# Altium footprint library 5.12-直插元件.PcbLib: 165 footprints (part 5 of 11)
Each footprint in its own frame and in the unit in brackets; x right, y up, seen from the top. Pads: shape width x height; smd on the part's side, far side on the other; paste and mask are expansions set on the pad; w line width, h text height; cw(c..) or ccw(c..) is an arc to the next point about the centre after c.
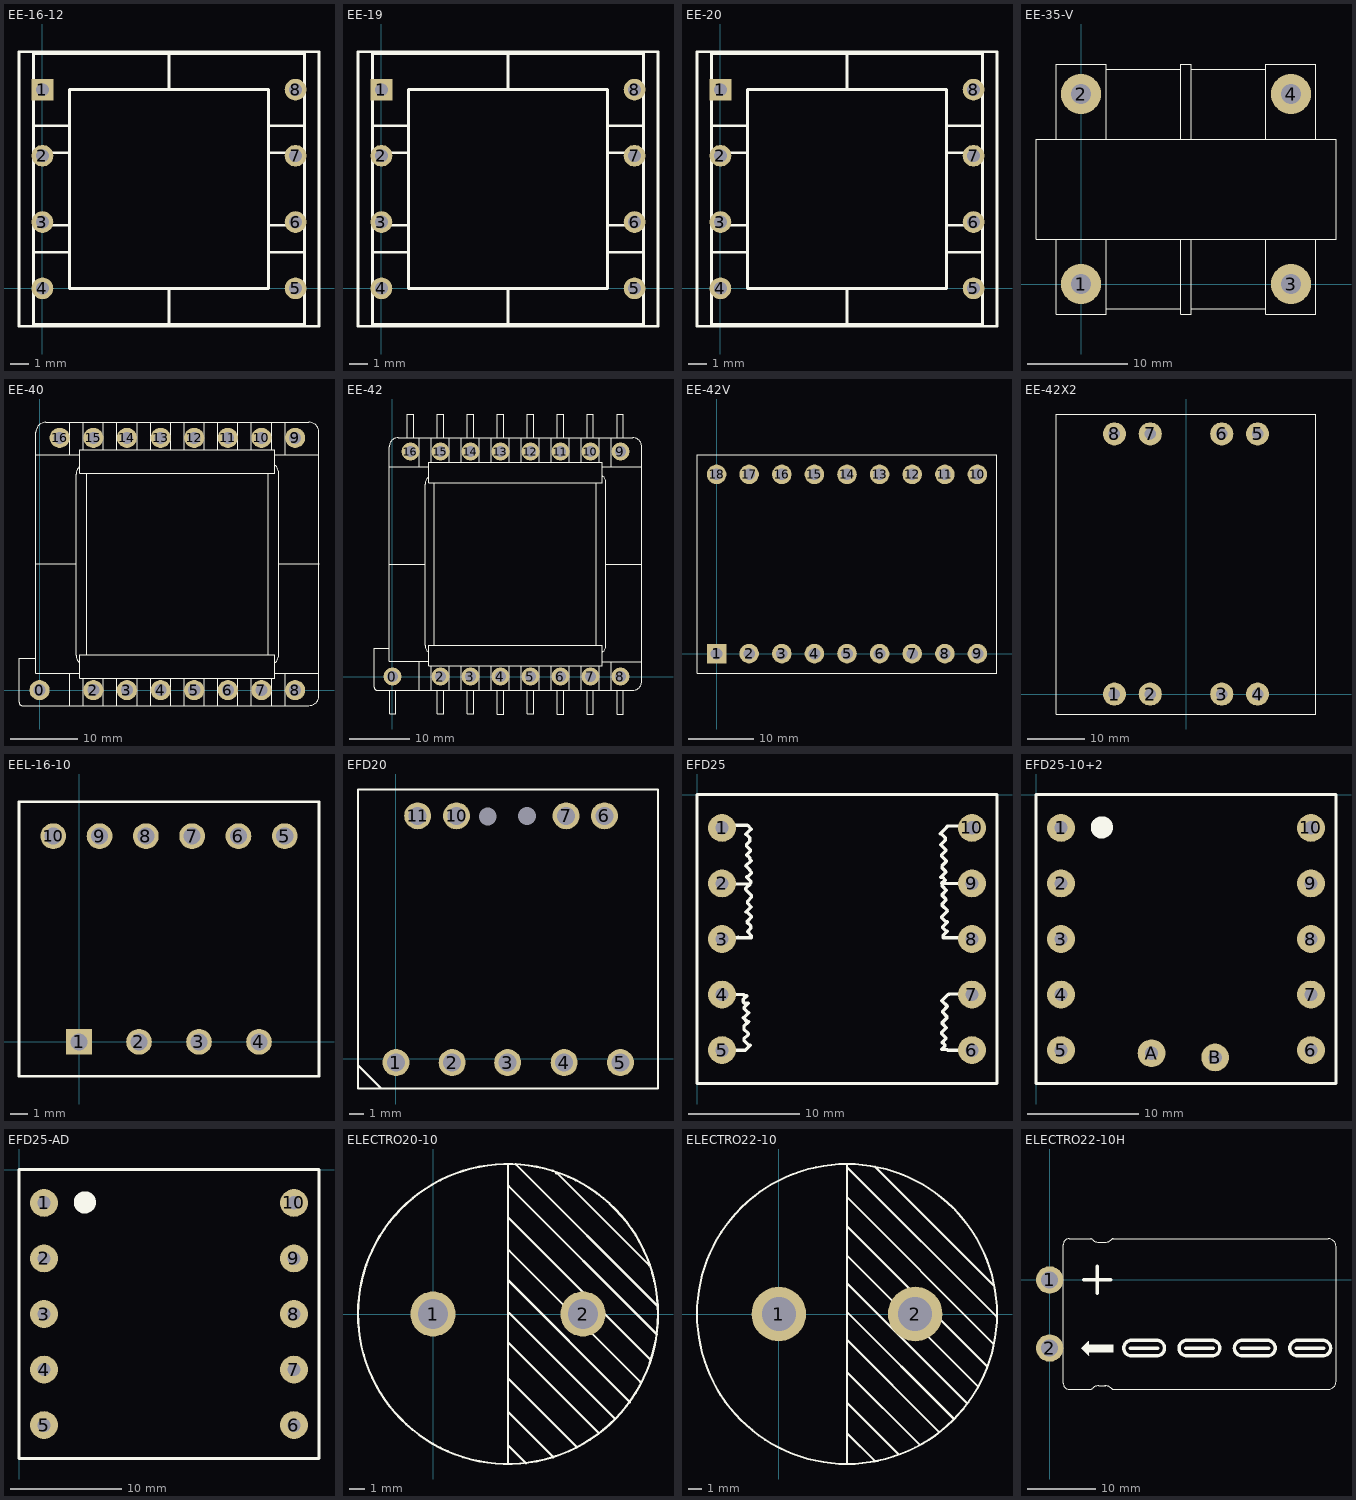
[diagram p4: the footprints below, top view; thin cyan lines are the x and y axes]

## EE-16-12 [mm] "[ PCBѧϰȺ514746572 ]"
pads (8):
  rect 1.2x1.2 hole 0.7: 1(0,11)
  round 1.2 hole 0.7: 2(0,7.34) 3(0,3.67) 4(0,0) 5(14,0) 6(14,3.67) 7(14,7.34) 8(14,11)
Top Overlay:
  lines w0.15: -0.5,2 1.5,2 ; -0.5,3.5 1.5,3.5 ; -0.5,7.5 1.5,7.5 ; -0.5,9 1.5,9 ; 7,-2 7,0 ; 7,11 7,13 ; 12.5,2 14.5,2 ; 12.5,3.5 14.5,3.5 ; 12.5,7.5 14.5,7.5 ; 12.5,9 14.5,9 ; -1.3,-2.1 -1.3,13.1 15.3,13.1 15.3,-2.1 -1.3,-2.1 ; -0.5,-2 -0.5,13 14.5,13 14.5,-2 -0.5,-2 ; 1.5,0 12.5,0 12.5,11 1.5,11 1.5,0
3D body "User Library-EE-16A.step": height 17.95, standoff -3.1, extent -0.965,-3.175 14.935,14.525

## EE-19 [mm] "[ PCBѧϰȺ514746572 ]"
pads (8):
  rect 1.2x1.2 hole 0.7: 1(0,11)
  round 1.2 hole 0.7: 2(0,7.34) 3(0,3.67) 4(0,0) 5(14,0) 6(14,3.67) 7(14,7.34) 8(14,11)
Top Overlay:
  lines w0.15: -0.5,2 1.5,2 ; -0.5,3.5 1.5,3.5 ; -0.5,7.5 1.5,7.5 ; -0.5,9 1.5,9 ; 7,-2 7,0 ; 7,11 7,13 ; 12.5,2 14.5,2 ; 12.5,3.5 14.5,3.5 ; 12.5,7.5 14.5,7.5 ; 12.5,9 14.5,9 ; -1.3,-2.1 15.3,-2.1 15.3,13.1 -1.3,13.1 -1.3,-2.1 ; -0.5,-2 14.5,-2 14.5,13 -0.5,13 -0.5,-2 ; 1.5,0 1.5,11 12.5,11 12.5,0 1.5,0
3D body "User Library-EE-19C.step": height 19.2, standoff -4.65, extent -1.24,-3.946 14.5,15.654

## EE-20 [mm] "[ PCBѧϰȺ514746572 ]"
pads (8):
  rect 1.2x1.2 hole 0.7: 1(0,11)
  round 1.2 hole 0.7: 2(0,7.34) 3(0,3.67) 4(0,0) 5(14,0) 6(14,3.67) 7(14,7.34) 8(14,11)
Top Overlay:
  lines w0.15: -0.5,2 1.5,2 ; -0.5,3.5 1.5,3.5 ; -0.5,7.5 1.5,7.5 ; -0.5,9 1.5,9 ; 7,-2 7,0 ; 7,11 7,13 ; 12.5,2 14.5,2 ; 12.5,3.5 14.5,3.5 ; 12.5,7.5 14.5,7.5 ; 12.5,9 14.5,9 ; -1.3,-2.1 15.3,-2.1 15.3,13.1 -1.3,13.1 -1.3,-2.1 ; -0.5,-2 14.5,-2 14.5,13 -0.5,13 -0.5,-2 ; 1.5,0 1.5,11 12.5,11 12.5,0 1.5,0
3D body "User Library-Phone Line Transformer.step": height 17, standoff -2, extent -1.732,-4.471 15.768,15.529

## EE-35-V [mm] "[ PCBѧϰȺ514746572 ]"
pads (4):
  round 4 hole 2: 1(0,0) 2(0,19) 3(21,0) 4(21,19)
Top Overlay:
  lines w0.1: 2.5,-2.453 10,-2.453 ; 2.5,4.5 2.5,-3 -2.5,-3 -2.5,4.5 ; 2.5,14.5 2.5,22 -2.5,22 ; 2.5,21.453 10,21.453 ; 10,4.5 10,-3 11,-3 11,4.5 ; 10,14.5 10,22 11,22 11,14.5 ; 11,-2.453 18.5,-2.453 ; 11,21.453 18.5,21.453 ; 18.5,4.5 18.5,-3 23.5,-3 23.5,4.5 ; 18.5,14.5 18.5,22 23.5,22 23.5,14.5 ; -2.5,4.5 23.5,4.5 ; -2.5,4.5 -4.5,4.5 -4.5,14.5 25.5,14.5 25.5,4.5 23.5,4.5 ; -2.5,22 -2.5,14.5 -2.5,22 ; 0,19.25 0,19.25
3D body "ee35-4.STEP": height 35.61, standoff -5.5, extent -4.23,-2.75 25.23,21.75

## EE-40 [mm] "[ PCBѧϰȺ514746572 ]"
pads (16):
  round 3 hole 1.8: 0(0,0) 2(8,0) 3(13,0) 4(18,0) 5(23,0) 6(28,0) 7(33,0) 8(38,0) 9(38,37.5) 10(33,37.5) 11(28,37.5) 12(23,37.5) 13(18,37.5) 14(13,37.5) 15(8,37.5) 16(3,37.5)
Top Overlay:
  lines w0.1: -2.55,-2.303 40.05,-2.303 ; -2.55,-2.3 cw(c-2.55,-1.8) -3.05,-1.8 -3.05,4.7 -0.556,4.7 ; -0.55,2.509 -0.55,38.3 cw(c0.95,38.3) 0.95,39.8 40.05,39.8 cw(c40.05,38.3) 41.55,38.3 41.55,-0.8 cw(c40.05,-0.8) 40.05,-2.3 ; -0.55,18.75 5.449,18.75 ; -0.544,2.509 6,2.509 ; -0.544,34.991 6,34.991 ; 4.5,-2.303 4.5,2.509 ; 4.5,34.991 4.5,39.8 ; 5.995,4.043 cw(c6.949,5.2) 5.449,5.2 5.449,32.079 cw(c6.949,32.079) 5.995,33.236 ; 6.5,-2.303 6.5,1.75 ; 6.5,35.75 6.5,39.8 ; 7,5.25 7,32.25 ; 9.5,-2.303 9.5,1.75 ; 9.5,35.75 9.5,39.8 ; 11.5,-2.303 11.5,1.75 ; 11.5,35.75 11.5,39.8 ; 14.5,-2.303 14.5,1.75 ; 14.5,35.75 14.5,39.8 ; 16.5,-2.303 16.5,1.75 ; 16.5,35.75 16.5,39.8 ; 19.5,-2.303 19.5,1.75 ; 19.5,35.75 19.5,39.8 ; 21.5,-2.303 21.5,1.75 ; 21.5,35.75 21.5,39.8 ; 24.5,-2.303 24.5,1.75 ; 24.5,35.75 24.5,39.8 ; 26.5,-2.303 26.5,1.75 ; 26.5,35.75 26.5,39.8 ; 29.5,-2.303 29.5,1.75 ; 29.5,35.75 29.5,39.8 ; 31.5,-2.303 31.5,1.75 ; 31.5,35.75 31.5,39.8 ; 34,5.25 34,32.25 ; 34.5,-2.303 34.5,1.75 ; 34.5,35.75 34.5,39.8 ; 35,2.5 41.55,2.5 ; 35,35 41.55,35 ; 35.005,4.042 ccw(c34.051,5.199) 35.551,5.199 35.551,32.3 ccw(c34.051,32.3) 35.005,33.457 ; 35.551,18.75 41.55,18.75 ; 36.5,-2.303 36.5,2.5 ; 36.5,35 36.5,39.8 ; 6,1.75 6,5.25 35,5.25 35,1.75 ; 6,1.75 35,1.75 ; 6,1.75 35,1.75 ; 6,32.25 6,35.75 35,35.75 35,32.25 6,32.25
3D body "User Library-power_transformer.step": height 32.94, standoff -3.5, extent 0.254,-3.478 40.259,40.562

## EE-42 [mm] "[ PCBѧϰȺ514746572 ]"
pads (16):
  round 3 hole 1.8: 0(0,0) 2(8,0) 3(13,0) 4(18,0) 5(23,0) 6(28,0) 7(33,0) 8(38,0) 9(38,37.5) 10(33,37.5) 11(28,37.5) 12(23,37.5) 13(18,37.5) 14(13,37.5) 15(8,37.5) 16(3,37.5)
Top Overlay:
  lines w0.1: -2.55,-2.303 40.05,-2.303 ; -2.55,-2.3 cw(c-2.55,-1.8) -3.05,-1.8 -3.05,4.7 -0.556,4.7 ; -0.55,2.509 -0.55,38.3 cw(c0.95,38.3) 0.95,39.8 40.05,39.8 cw(c40.05,38.3) 41.55,38.3 41.55,-0.8 cw(c40.05,-0.8) 40.05,-2.3 ; -0.55,18.75 5.449,18.75 ; -0.544,2.509 6,2.509 ; -0.544,34.991 6,34.991 ; -0.5,-2.303 -0.5,-6.248 0.5,-6.248 0.5,-2.303 ; 2.5,39.809 2.5,43.75 3.5,43.75 3.5,39.814 ; 4.5,-2.303 4.5,2.509 ; 4.5,34.991 4.5,39.8 ; 5.995,4.043 cw(c6.949,5.2) 5.449,5.2 5.449,32.079 cw(c6.949,32.079) 5.995,33.236 ; 6.5,-2.303 6.5,1.75 ; 6.5,35.75 6.5,39.8 ; 7,5.25 7,32.25 ; 7.5,-2.3 7.5,-6.248 8.493,-6.248 8.5,-6.241 8.5,-2.3 ; 7.5,39.8 7.5,43.748 8.493,43.748 8.5,43.741 8.5,39.8 ; 9.5,-2.303 9.5,1.75 ; 9.5,35.75 9.5,39.8 ; 11.5,-2.303 11.5,1.75 ; 11.5,35.75 11.5,39.8 ; 12.5,-2.3 12.5,-6.247 13.5,-6.247 13.5,-2.3 ; 12.5,39.8 12.5,43.747 13.5,43.747 13.5,39.8 ; 14.5,-2.303 14.5,1.75 ; 14.5,35.75 14.5,39.8 ; 16.5,-2.303 16.5,1.75 ; 16.5,35.75 16.5,39.8 ; 17.5,-2.3 17.5,-6.25 18.5,-6.25 18.5,-2.311 ; 17.5,39.8 17.5,43.75 18.5,43.75 18.5,39.811 ; 19.5,-2.303 19.5,1.75 ; 19.5,35.75 19.5,39.8 ; 21.5,-2.303 21.5,1.75 ; 21.5,35.75 21.5,39.8 ; 22.5,-2.3 22.5,-6.238 23.495,-6.238 23.5,-6.233 23.5,-2.3 ; 22.5,39.8 22.5,43.738 23.495,43.738 23.5,43.733 23.5,39.8 ; 24.5,-2.303 24.5,1.75 ; 24.5,35.75 24.5,39.8 ; 26.5,-2.303 26.5,1.75 ; 26.5,35.75 26.5,39.8 ; 27.5,-2.311 27.5,-6.25 28.5,-6.25 28.5,-2.313 ; 27.5,39.811 27.5,43.75 28.5,43.75 28.5,39.813 ; 29.5,-2.303 29.5,1.75 ; 29.5,35.75 29.5,39.8 ; 31.5,-2.303 31.5,1.75 ; 31.5,35.75 31.5,39.8 ; 32.5,-2.309 32.5,-6.25 33.488,-6.25 33.488,-2.313 ; 32.5,39.809 32.5,43.75 33.488,43.75 33.488,39.813 ; 34,5.25 34,32.25 ; 34.5,-2.303 34.5,1.75 ; 34.5,35.75 34.5,39.8 ; 35,2.5 41.55,2.5 ; 35,35 41.55,35 ; 35.005,4.042 ccw(c34.051,5.199) 35.551,5.199 35.551,32.3 ccw(c34.051,32.3) 35.005,33.457 ; 35.551,18.75 41.55,18.75 ; 36.5,-2.303 36.5,2.5 ; 36.5,35 36.5,39.8 ; 37.5,-2.324 37.5,-6.25 38.5,-6.25 38.5,-2.317 ; 37.5,39.824 37.5,43.75 38.5,43.75 38.5,39.817 ; 6,1.75 6,5.25 35,5.25 35,1.75 ; 6,1.75 35,1.75 ; 6,1.75 35,1.75 ; 6,32.25 6,35.75 35,35.75 35,32.25 6,32.25
3D body "Coilcraft-GA3366-BL.step": height 29.2, standoff -5, extent -0.229,-3 40.271,40.5

## EE-42V [mm] "[ PCBѧϰȺ514746572 ]"
pads (18):
  rect 3x3 hole 1.8: 1(0,0)
  round 3 hole 1.8: 2(5,0) 3(10,0) 4(15,0) 5(20,0) 6(25,0) 7(30,0) 8(35,0) 9(40,0) 10(40,27.5) 11(35,27.5) 12(30,27.5) 13(25,27.5) 14(20,27.5) 15(15,27.5) 16(10,27.5) 17(5,27.5) 18(0,27.5)
Top Overlay:
  lines w0.1: -3,-3 -3,30.5 43,30.5 43,-3 -3,-3
3D body "EE42.STEP": height 48.81, standoff -4.15, extent -2.75,-2.6 42.75,30.1

## EE-42X2 [mm] "[ PCBѧϰȺ514746572 ]"
pads (8):
  round 4 hole 2: 1(-12.4,0) 2(-6.2,0) 3(6.2,0) 4(12.4,0) 5(12.4,45.1) 6(6.2,45.1) 7(-6.2,45.1) 8(-12.4,45.1)
Top Overlay:
  lines w0.1: -22.5,-3.45 22.5,-3.45 22.5,48.55 -22.5,48.55 -22.5,-3.45
3D body "EE42x2.STEP": height 44.16, standoff -3.2, extent -21.227,-1.905 20.973,47.095

## EEL-16-10 [mm] "[ PCBѧϰȺ514746572 ]"
pads (10):
  rect 1.5x1.5 hole 1: 1(0,0)
  round 1.5 hole 1: 2(3.5,0) 3(7,0) 4(10.5,0) 5(12,12) 6(9.3,12) 7(6.6,12) 8(3.9,12) 9(1.2,12) 10(-1.5,12)
Top Overlay:
  lines w0.15: -3.5,-2 14,-2 14,14 -3.5,14 -3.5,-2
3D body "User Library-EE-16A.step": height 17.95, standoff -3.1, extent -3.6,-1.95 14.1,13.95

## EFD20 [mil] "[ PCBѧϰȺ514746572 ]"
pads (11):
  round 71 hole 47.24: 1(0,-9.84) 2(148,-9.84) 3(294,-9.84) 4(443,-9.84) 5(591,-9.84) 6(549,639.76) 7(448,639.76) 10(159.46,639.76)
  round 0 hole 47.24: 8(345,639.76) 9(241.61,638.58)
  round 70.98 hole 47.24: 11(57.13,639.76)
Top Overlay:
  lines w6: -100,-17 -39,-78 ; 289,-78 690,-78 690,709 -100,709 -100,-78 294,-78
3D body "User Library-E20-FERR-TRANSF.step": height 620.08, standoff -137.8, extent -98.7,-168.75 688.7,799.75

## EFD25 [mm] "[ PCBѧϰȺ514746572 ]"
pads (10):
  round 2.5 hole 1.2: 1(2.25,-3) 2(2.25,-8) 3(2.25,-13) 4(2.25,-18) 5(2.25,-23) 6(24.75,-23) 7(24.75,-18) 8(24.75,-13) 9(24.75,-8) 10(24.75,-3)
Top Overlay:
  drawing of 158 lines, arcs and shapes, not listed
3D body "User Library-EFD-25-13-9.step": height 12.9, standoff -3.5, extent 0.066,-26.59 26.934,0.59

## EFD25-10+2 [mm] "[ PCBѧϰȺ514746572 ]"
pads (12):
  round 2.5 hole 1.2: 1(2.25,-3) 2(2.25,-8) 3(2.25,-13) 4(2.25,-18) 5(2.25,-23) 6(24.75,-23) 7(24.75,-18) 8(24.75,-13) 9(24.75,-8) 10(24.75,-3) A(10.4,-23.278) B(16.124,-23.66)
Top Overlay:
  circle w1: c5.927,-2.955 r0.5
  lines w0.3: 0,-26 0,0 27,0 27,-26 0,-26
3D body "User Library-EFD-25-13-9.step": height 12.9, standoff -3.5, extent 0.066,-26.59 26.934,0.59

## EFD25-AD [mm] "[ PCBѧϰȺ514746572 ]"
pads (10):
  round 2.5 hole 1.2: 1(2.25,-3) 2(2.25,-8) 3(2.25,-13) 4(2.25,-18) 5(2.25,-23) 6(24.75,-23) 7(24.75,-18) 8(24.75,-13) 9(24.75,-8) 10(24.75,-3)
Top Overlay:
  circle w1: c5.927,-2.955 r0.5
  lines w0.3: 0,-26 27,-26 27,0 0,0 0,-26
3D body "User Library-EFD-25-13-9.step": height 12.9, standoff -3.5, extent 0.066,-26.59 26.934,0.59

## ELECTRO20-10 [mm] "[ PCBѧϰȺ514746572 ]"
pads (2):
  round 3 hole 2: 1(0,0) 2(10,0)
Top Overlay:
  lines w0.15: 5,-9.978 5,9.949 ; 5,-8.669 5,-8.747 6.2,-9.947 ; 5,-6.436 5,-6.511 8.037,-9.548 ; 5,-4.204 5,-4.279 9.591,-8.87 ; 5,-1.773 5,-1.886 11.067,-7.953 ; 5,0.061 5.088,0.061 12.103,-6.955 ; 5,2.294 5,2.259 13.139,-5.88 ; 5,4.209 5.085,4.209 13.818,-4.524 ; 5,6.599 5,6.445 14.534,-3.089 ; 5,8.514 5.044,8.514 14.933,-1.374 ; 5.524,9.99 14.973,0.541 ; 8.194,9.39 8.275,9.39 14.414,3.251 ; 15,-0.01 cw(c5,0) 15,0
3D body "20-10.STEP": height 1.5, standoff -25.5, extent -5,-10 15,10

## ELECTRO22-10 [mm] "[ PCBѧϰȺ514746572 ]"
pads (2):
  round 4 hole 2.5: 1(0,0) 2(10,0)
Top Overlay:
  lines w0.15: 5,-11 5,11 ; 5,-8.669 5,-8.747 7.06,-10.806 ; 5,-6.436 5,-6.511 8.778,-10.29 ; 5,-4.204 5,-4.279 10.323,-9.602 ; 5,-1.773 5,-1.886 11.736,-8.621 ; 5,0.061 5.088,0.061 12.81,-7.662 ; 5,2.294 5,2.259 13.801,-6.541 ; 5,4.209 5.085,4.209 14.602,-5.308 ; 5,6.599 5,6.445 15.296,-3.85 ; 5,8.514 5.044,8.514 15.735,-2.177 ; 5,10.751 15.967,-0.216 ; 7.049,10.814 15.735,2.129 ; 16,-0.011 cw(c5,0) 16,0
3D body "22-10.STEP": height 1.5, standoff -25.5, extent -6,-11 16,11

## ELECTRO22-10H [mm] "[ PCBѧϰȺ514746572 ]"
pads (2):
  round 4 hole 2.5: 1(0,0) 2(0,-10)
Top Overlay:
  region: 9.058,-10.508 9.058,-9.492 5.756,-9.492 5.756,-10.508
  region: 9.312,-10.508 9.312,-9.492 8.296,-9.492 8.296,-10.508
  lines w0.1: 4.851,-10.111 4.851,-9.934 4.892,-9.893 ; 5.421,-10.681 5.421,-9.319 5.437,-9.303 ; 5.635,-9.105 5.645,-9.116 5.645,-10.905 ; 7.354,-15.525 8.102,-15.525 cw(c8.102,-16.935) 9.099,-15.938 ccw(c9.309,-15.728) 9.309,-16.025 40.894,-16.025 ccw(c40.894,-14.919) 42,-14.919 42,4.919 ccw(c40.894,4.919) 40.894,6.025 9.309,6.025 ccw(c9.309,5.728) 9.099,5.938 cw(c8.102,6.935) 8.102,5.525 7.354,5.525 ; 8.212,-15.525 7.207,-15.525 ccw(c7.207,-16.812) 6.297,-15.902 cw(c6,-15.605) 6,-16.025 2.845,-16.025 cw(c2.845,-15.191) 2.011,-15.191 2.011,5.191 cw(c2.845,5.191) 2.845,6.025 6,6.025 cw(c6,5.605) 6.297,5.902 ccw(c7.207,6.812) 7.207,5.525 8.212,5.525
  lines w0.15: 4.963,-10.223 4.963,-9.777 ; 5.097,-10.357 5.097,-9.643 ; 5.226,-10.486 5.226,-9.514 ; 5.365,-10.528 5.365,-9.375 ; 5.531,-10.778 5.531,-9.209 ; 5.756,-10.508 9.312,-10.508 9.312,-9.746 9.312,-9.492 5.756,-9.492 ; 4.74,-10 5.756,-8.984 5.756,-10.762 5.756,-11.016 4.74,-10
  lines w0.5: 4.98,0 6.98,0 ; 6.98,-2 6.98,0 ; 6.98,2 6.98,0 ; 8.98,0 6.98,0 ; 11.824,-10 15.884,-10 ; 19.944,-10 24.004,-10 ; 28.064,-10 32.124,-10 ; 36.184,-10 40.244,-10 ; 12,-11.136 cw(c12,-10) 12,-8.864 15.707,-8.864 cw(c15.707,-10) 15.707,-11.136 12,-11.136 ; 20.12,-11.136 cw(c20.12,-10) 20.12,-8.864 23.827,-8.864 cw(c23.827,-10) 23.827,-11.136 20.12,-11.136 ; 28.24,-11.136 cw(c28.24,-10) 28.24,-8.864 31.947,-8.864 cw(c31.947,-10) 31.947,-11.136 28.24,-11.136 ; 36.36,-11.136 cw(c36.36,-10) 36.36,-8.864 40.067,-8.864 cw(c40.067,-10) 40.067,-11.136 36.36,-11.136
3D body "22-10.STEP": height -0.5, standoff -22.5, extent -0.036,-16 26.964,6
3D body "22-10.STEP": height -0.5, standoff -22.5, extent 15.05,-16 42.05,6
3D body: height 11.08, standoff -5, extent -0.496,-10.499 0.5,-9.501
3D body: height 11.58, standoff 10.58, extent -0.495,-10.498 0.5,-9.502
3D body: height 11.58, standoff 10.58, extent -0.495,-0.498 0.5,0.498
3D body: height 11.08, standoff -5, extent -0.496,-0.499 0.5,0.499